# Altium schematic symbol library jlcpcb_2025_04_capacitors_extended_0402.schlib: 3594 symbols (part 3 of 20) (continued)
## 0402N500J500CT
designator C?  Capacitance: 50pF  (hidden comment: *)
Capacitor, Ceramic (MLCC), 50pF, ±5%, 50V, NP0, ±5%, SMD 0402; Manufacturer: Walsin Tech Corp; Manufacturer Part Number: 0402N500J500CT; Package Size: 0402; JLCPCB Basic Part: No; JLCPCB Part Number: C458867; Supplier 1: LCSC; Category: Capacitors - MLCC; Supplier Part Number 1: C458867; Tolerance: ±5%; Voltage Rating: 50V; Temperature Coefficient: NP0; RoHS: Yes; ComponentLink1Description: Datasheet; ComponentLink1URL: https://wmsc.lcsc.com/wmsc/upload/file/pdf/v2/lcsc/2304140030_Walsin-Tech-Corp-0402N500J500CT_C458867.pdf; ComponentLink2Description: JLCPCB Part URL; ComponentLink2URL: https://jlcpcb.com/partdetail/C458867; ComponentLink3Description: LCSC Part URL; ComponentLink3URL: https://lcsc.com/product-detail/Multilayer-Ceramic-Capacitors-MLCC---SMD-SMT_Walsin-Tech-Corp-Walsin-Tech-Corp-0402N500J500CT_C458867.html
footprint CAP-0402 (0402 (1005M) Capacitor)
pins: 1, 2

## 0402N510J500CT
designator C?  Capacitance: 51pF  (hidden comment: *)
Capacitor, Ceramic (MLCC), 51pF, ±5%, 50V, NP0, ±5%, SMD 0402; Manufacturer: Walsin Tech Corp; Manufacturer Part Number: 0402N510J500CT; Package Size: 0402; JLCPCB Basic Part: No; JLCPCB Part Number: C295991; Supplier 1: LCSC; Category: Capacitors - MLCC; Supplier Part Number 1: C295991; Tolerance: ±5%; Voltage Rating: 50V; Temperature Coefficient: NP0; RoHS: Yes; ComponentLink1Description: Datasheet; ComponentLink1URL: https://wmsc.lcsc.com/wmsc/upload/file/pdf/v2/lcsc/2304140030_Walsin-Tech-Corp-0402N510J500CT_C295991.pdf; ComponentLink2Description: JLCPCB Part URL; ComponentLink2URL: https://jlcpcb.com/partdetail/C295991; ComponentLink3Description: LCSC Part URL; ComponentLink3URL: https://lcsc.com/product-detail/Multilayer-Ceramic-Capacitors-MLCC---SMD-SMT_Walsin-Tech-Corp-Walsin-Tech-Corp-0402N510J500CT_C295991.html
footprint CAP-0402 (0402 (1005M) Capacitor)
pins: 1, 2

## 0402N511J500CT
designator C?  Capacitance: 510pF  (hidden comment: *)
Capacitor, Ceramic (MLCC), 510pF, ±5%, 50V, NP0, ±5%, SMD 0402; Manufacturer: Walsin Tech Corp; Manufacturer Part Number: 0402N511J500CT; Package Size: 0402; JLCPCB Basic Part: No; JLCPCB Part Number: C387980; Supplier 1: LCSC; Category: Capacitors - MLCC; Supplier Part Number 1: C387980; Tolerance: ±5%; Voltage Rating: 50V; Temperature Coefficient: NP0; RoHS: Yes; ComponentLink1Description: Datasheet; ComponentLink1URL: https://wmsc.lcsc.com/wmsc/upload/file/pdf/v2/lcsc/2304140030_Walsin-Tech-Corp-0402N511J500CT_C387980.pdf; ComponentLink2Description: JLCPCB Part URL; ComponentLink2URL: https://jlcpcb.com/partdetail/C387980; ComponentLink3Description: LCSC Part URL; ComponentLink3URL: https://lcsc.com/product-detail/Multilayer-Ceramic-Capacitors-MLCC---SMD-SMT_Walsin-Tech-Corp-Walsin-Tech-Corp-0402N511J500CT_C387980.html
footprint CAP-0402 (0402 (1005M) Capacitor)
pins: 1, 2

## 0402N560G500CT
designator C?  Capacitance: 56pF  (hidden comment: *)
Capacitor, Ceramic (MLCC), 56pF, ±2%, 50V, NP0, ±2%, SMD 0402; Manufacturer: Walsin Tech Corp; Manufacturer Part Number: 0402N560G500CT; Package Size: 0402; JLCPCB Basic Part: No; JLCPCB Part Number: C388118; Supplier 1: LCSC; Category: Capacitors - MLCC; Supplier Part Number 1: C388118; Tolerance: ±2%; Voltage Rating: 50V; Temperature Coefficient: NP0; RoHS: Yes; ComponentLink1Description: Datasheet; ComponentLink1URL: https://wmsc.lcsc.com/wmsc/upload/file/pdf/v2/lcsc/2304140030_Walsin-Tech-Corp-0402N560G500CT_C388118.pdf; ComponentLink2Description: JLCPCB Part URL; ComponentLink2URL: https://jlcpcb.com/partdetail/C388118; ComponentLink3Description: LCSC Part URL; ComponentLink3URL: https://lcsc.com/product-detail/Multilayer-Ceramic-Capacitors-MLCC---SMD-SMT_Walsin-Tech-Corp-Walsin-Tech-Corp-0402N560G500CT_C388118.html
footprint CAP-0402 (0402 (1005M) Capacitor)
pins: 1, 2

## 0402N560J101CT
designator C?  Capacitance: 56pF  (hidden comment: *)
Capacitor, Ceramic (MLCC), 56pF, ±5%, 100V, NP0, ±5%, SMD 0402; Manufacturer: Walsin Tech Corp; Manufacturer Part Number: 0402N560J101CT; Package Size: 0402; JLCPCB Basic Part: No; JLCPCB Part Number: C525497; Supplier 1: LCSC; Category: Capacitors - MLCC; Supplier Part Number 1: C525497; Tolerance: ±5%; Voltage Rating: 100V; Temperature Coefficient: NP0; RoHS: Yes; ComponentLink1Description: Datasheet; ComponentLink1URL: https://wmsc.lcsc.com/wmsc/upload/file/pdf/v2/lcsc/2304140030_Walsin-Tech-Corp-0402N560J101CT_C525497.pdf; ComponentLink2Description: JLCPCB Part URL; ComponentLink2URL: https://jlcpcb.com/partdetail/C525497; ComponentLink3Description: LCSC Part URL; ComponentLink3URL: https://lcsc.com/product-detail/Multilayer-Ceramic-Capacitors-MLCC---SMD-SMT_Walsin-Tech-Corp-Walsin-Tech-Corp-0402N560J101CT_C525497.html
footprint CAP-0402 (0402 (1005M) Capacitor)
pins: 1, 2

## 0402N560J500CT
designator C?  Capacitance: 56pF  (hidden comment: *)
Capacitor, Ceramic (MLCC), 56pF, ±5%, 50V, NP0, ±5%, SMD 0402; Manufacturer: Walsin Tech Corp; Manufacturer Part Number: 0402N560J500CT; Package Size: 0402; JLCPCB Basic Part: No; JLCPCB Part Number: C301986; Supplier 1: LCSC; Category: Capacitors - MLCC; Supplier Part Number 1: C301986; Tolerance: ±5%; Voltage Rating: 50V; Temperature Coefficient: NP0; RoHS: Yes; ComponentLink1Description: Datasheet; ComponentLink1URL: https://wmsc.lcsc.com/wmsc/upload/file/pdf/v2/lcsc/2304140030_Walsin-Tech-Corp-0402N560J500CT_C301986.pdf; ComponentLink2Description: JLCPCB Part URL; ComponentLink2URL: https://jlcpcb.com/partdetail/C301986; ComponentLink3Description: LCSC Part URL; ComponentLink3URL: https://lcsc.com/product-detail/Multilayer-Ceramic-Capacitors-MLCC---SMD-SMT_Walsin-Tech-Corp-Walsin-Tech-Corp-0402N560J500CT_C301986.html
footprint CAP-0402 (0402 (1005M) Capacitor)
pins: 1, 2

## 0402N561J500CT
designator C?  Capacitance: 560pF  (hidden comment: *)
Capacitor, Ceramic (MLCC), 560pF, ±5%, 50V, NP0, ±5%, SMD 0402; Manufacturer: Walsin Tech Corp; Manufacturer Part Number: 0402N561J500CT; Package Size: 0402; JLCPCB Basic Part: No; JLCPCB Part Number: C295992; Supplier 1: LCSC; Category: Capacitors - MLCC; Supplier Part Number 1: C295992; Tolerance: ±5%; Voltage Rating: 50V; Temperature Coefficient: NP0; RoHS: Yes; ComponentLink1Description: Datasheet; ComponentLink1URL: https://wmsc.lcsc.com/wmsc/upload/file/pdf/v2/lcsc/2304140030_Walsin-Tech-Corp-0402N561J500CT_C295992.pdf; ComponentLink2Description: JLCPCB Part URL; ComponentLink2URL: https://jlcpcb.com/partdetail/C295992; ComponentLink3Description: LCSC Part URL; ComponentLink3URL: https://lcsc.com/product-detail/Multilayer-Ceramic-Capacitors-MLCC---SMD-SMT_Walsin-Tech-Corp-Walsin-Tech-Corp-0402N561J500CT_C295992.html
footprint CAP-0402 (0402 (1005M) Capacitor)
pins: 1, 2

## 0402N620J500CT
designator C?  Capacitance: 62pF  (hidden comment: *)
Capacitor, Ceramic (MLCC), 62pF, ±5%, 50V, NP0, ±5%, SMD 0402; Manufacturer: Walsin Tech Corp; Manufacturer Part Number: 0402N620J500CT; Package Size: 0402; JLCPCB Basic Part: No; JLCPCB Part Number: C295994; Supplier 1: LCSC; Category: Capacitors - MLCC; Supplier Part Number 1: C295994; Tolerance: ±5%; Voltage Rating: 50V; Temperature Coefficient: NP0; RoHS: Yes; ComponentLink1Description: Datasheet; ComponentLink1URL: https://wmsc.lcsc.com/wmsc/upload/file/pdf/v2/lcsc/2304140030_Walsin-Tech-Corp-0402N620J500CT_C295994.pdf; ComponentLink2Description: JLCPCB Part URL; ComponentLink2URL: https://jlcpcb.com/partdetail/C295994; ComponentLink3Description: LCSC Part URL; ComponentLink3URL: https://lcsc.com/product-detail/Multilayer-Ceramic-Capacitors-MLCC---SMD-SMT_Walsin-Tech-Corp-Walsin-Tech-Corp-0402N620J500CT_C295994.html
footprint CAP-0402 (0402 (1005M) Capacitor)
pins: 1, 2

## 0402N621J500CT
designator C?  Capacitance: 620pF  (hidden comment: *)
Capacitor, Ceramic (MLCC), 620pF, ±5%, 50V, NP0, ±5%, SMD 0402; Manufacturer: Walsin Tech Corp; Manufacturer Part Number: 0402N621J500CT; Package Size: 0402; JLCPCB Basic Part: No; JLCPCB Part Number: C387982; Supplier 1: LCSC; Category: Capacitors - MLCC; Supplier Part Number 1: C387982; Tolerance: ±5%; Voltage Rating: 50V; Temperature Coefficient: NP0; RoHS: Yes; ComponentLink1Description: Datasheet; ComponentLink1URL: https://wmsc.lcsc.com/wmsc/upload/file/pdf/v2/lcsc/2304140030_Walsin-Tech-Corp-0402N621J500CT_C387982.pdf; ComponentLink2Description: JLCPCB Part URL; ComponentLink2URL: https://jlcpcb.com/partdetail/C387982; ComponentLink3Description: LCSC Part URL; ComponentLink3URL: https://lcsc.com/product-detail/Multilayer-Ceramic-Capacitors-MLCC---SMD-SMT_Walsin-Tech-Corp-Walsin-Tech-Corp-0402N621J500CT_C387982.html
footprint CAP-0402 (0402 (1005M) Capacitor)
pins: 1, 2

## 0402N680F500CT
designator C?  Capacitance: 68pF  (hidden comment: *)
Capacitor, Ceramic (MLCC), 68pF, ±1%, 50V, NP0, ±1%, SMD 0402; Manufacturer: Walsin Tech Corp; Manufacturer Part Number: 0402N680F500CT; Package Size: 0402; JLCPCB Basic Part: No; JLCPCB Part Number: C458869; Supplier 1: LCSC; Category: Capacitors - MLCC; Supplier Part Number 1: C458869; Tolerance: ±1%; Voltage Rating: 50V; Temperature Coefficient: NP0; RoHS: Yes; ComponentLink1Description: Datasheet; ComponentLink1URL: https://wmsc.lcsc.com/wmsc/upload/file/pdf/v2/lcsc/2304140030_Walsin-Tech-Corp-0402N680F500CT_C458869.pdf; ComponentLink2Description: JLCPCB Part URL; ComponentLink2URL: https://jlcpcb.com/partdetail/C458869; ComponentLink3Description: LCSC Part URL; ComponentLink3URL: https://lcsc.com/product-detail/Multilayer-Ceramic-Capacitors-MLCC---SMD-SMT_Walsin-Tech-Corp-Walsin-Tech-Corp-0402N680F500CT_C458869.html
footprint CAP-0402 (0402 (1005M) Capacitor)
pins: 1, 2

## 0402N680J500CT
designator C?  Capacitance: 68pF  (hidden comment: *)
Capacitor, Ceramic (MLCC), 68pF, ±5%, 50V, NP0, ±5%, SMD 0402; Manufacturer: Walsin Tech Corp; Manufacturer Part Number: 0402N680J500CT; Package Size: 0402; JLCPCB Basic Part: No; JLCPCB Part Number: C301990; Supplier 1: LCSC; Category: Capacitors - MLCC; Supplier Part Number 1: C301990; Tolerance: ±5%; Voltage Rating: 50V; Temperature Coefficient: NP0; RoHS: Yes; ComponentLink1Description: Datasheet; ComponentLink1URL: https://wmsc.lcsc.com/wmsc/upload/file/pdf/v2/lcsc/2304140030_Walsin-Tech-Corp-0402N680J500CT_C301990.pdf; ComponentLink2Description: JLCPCB Part URL; ComponentLink2URL: https://jlcpcb.com/partdetail/C301990; ComponentLink3Description: LCSC Part URL; ComponentLink3URL: https://lcsc.com/product-detail/Multilayer-Ceramic-Capacitors-MLCC---SMD-SMT_Walsin-Tech-Corp-Walsin-Tech-Corp-0402N680J500CT_C301990.html
footprint CAP-0402 (0402 (1005M) Capacitor)
pins: 1, 2

## 0402N680K500CT
designator C?  Capacitance: 68pF  (hidden comment: *)
Capacitor, Ceramic (MLCC), 68pF, ±10%, 50V, NP0, ±10%, SMD 0402; Manufacturer: Walsin Tech Corp; Manufacturer Part Number: 0402N680K500CT; Package Size: 0402; JLCPCB Basic Part: No; JLCPCB Part Number: C295995; Supplier 1: LCSC; Category: Capacitors - MLCC; Supplier Part Number 1: C295995; Tolerance: ±10%; Voltage Rating: 50V; Temperature Coefficient: NP0; RoHS: Yes; ComponentLink1Description: Datasheet; ComponentLink1URL: https://wmsc.lcsc.com/wmsc/upload/file/pdf/v2/lcsc/2304140030_Walsin-Tech-Corp-0402N680K500CT_C295995.pdf; ComponentLink2Description: JLCPCB Part URL; ComponentLink2URL: https://jlcpcb.com/partdetail/C295995; ComponentLink3Description: LCSC Part URL; ComponentLink3URL: https://lcsc.com/product-detail/Multilayer-Ceramic-Capacitors-MLCC---SMD-SMT_Walsin-Tech-Corp-Walsin-Tech-Corp-0402N680K500CT_C295995.html
footprint CAP-0402 (0402 (1005M) Capacitor)
pins: 1, 2

## 0402N681J500CT
designator C?  Capacitance: 680pF  (hidden comment: *)
Capacitor, Ceramic (MLCC), 680pF, ±5%, 50V, NP0, ±5%, SMD 0402; Manufacturer: Walsin Tech Corp; Manufacturer Part Number: 0402N681J500CT; Package Size: 0402; JLCPCB Basic Part: No; JLCPCB Part Number: C295996; Supplier 1: LCSC; Category: Capacitors - MLCC; Supplier Part Number 1: C295996; Tolerance: ±5%; Voltage Rating: 50V; Temperature Coefficient: NP0; RoHS: Yes; ComponentLink1Description: Datasheet; ComponentLink1URL: https://wmsc.lcsc.com/wmsc/upload/file/pdf/v2/lcsc/2304140030_Walsin-Tech-Corp-0402N681J500CT_C295996.pdf; ComponentLink2Description: JLCPCB Part URL; ComponentLink2URL: https://jlcpcb.com/partdetail/C295996; ComponentLink3Description: LCSC Part URL; ComponentLink3URL: https://lcsc.com/product-detail/Multilayer-Ceramic-Capacitors-MLCC---SMD-SMT_Walsin-Tech-Corp-Walsin-Tech-Corp-0402N681J500CT_C295996.html
footprint CAP-0402 (0402 (1005M) Capacitor)
pins: 1, 2

## 0402N820F500CT
designator C?  Capacitance: 82pF  (hidden comment: *)
Capacitor, Ceramic (MLCC), 82pF, ±1%, 50V, NP0, ±1%, SMD 0402; Manufacturer: Walsin Tech Corp; Manufacturer Part Number: 0402N820F500CT; Package Size: 0402; JLCPCB Basic Part: No; JLCPCB Part Number: C458871; Supplier 1: LCSC; Category: Capacitors - MLCC; Supplier Part Number 1: C458871; Tolerance: ±1%; Voltage Rating: 50V; Temperature Coefficient: NP0; RoHS: Yes; ComponentLink1Description: Datasheet; ComponentLink1URL: https://wmsc.lcsc.com/wmsc/upload/file/pdf/v2/lcsc/2304140030_Walsin-Tech-Corp-0402N820F500CT_C458871.pdf; ComponentLink2Description: JLCPCB Part URL; ComponentLink2URL: https://jlcpcb.com/partdetail/C458871; ComponentLink3Description: LCSC Part URL; ComponentLink3URL: https://lcsc.com/product-detail/Multilayer-Ceramic-Capacitors-MLCC---SMD-SMT_Walsin-Tech-Corp-Walsin-Tech-Corp-0402N820F500CT_C458871.html
footprint CAP-0402 (0402 (1005M) Capacitor)
pins: 1, 2

## 0402N820J250CT
designator C?  Capacitance: 82pF  (hidden comment: *)
Capacitor, Ceramic (MLCC), 82pF, ±5%, 25V, NP0, ±5%, SMD 0402; Manufacturer: Walsin Tech Corp; Manufacturer Part Number: 0402N820J250CT; Package Size: 0402; JLCPCB Basic Part: No; JLCPCB Part Number: C335531; Supplier 1: LCSC; Category: Capacitors - MLCC; Supplier Part Number 1: C335531; Tolerance: ±5%; Voltage Rating: 25V; Temperature Coefficient: NP0; RoHS: Yes; ComponentLink1Description: Datasheet; ComponentLink1URL: https://wmsc.lcsc.com/wmsc/upload/file/pdf/v2/lcsc/2304140030_Walsin-Tech-Corp-0402N820J250CT_C335531.pdf; ComponentLink2Description: JLCPCB Part URL; ComponentLink2URL: https://jlcpcb.com/partdetail/C335531; ComponentLink3Description: LCSC Part URL; ComponentLink3URL: https://lcsc.com/product-detail/Multilayer-Ceramic-Capacitors-MLCC---SMD-SMT_Walsin-Tech-Corp-Walsin-Tech-Corp-0402N820J250CT_C335531.html
footprint CAP-0402 (0402 (1005M) Capacitor)
pins: 1, 2

## 0402N820J500CT
designator C?  Capacitance: 82pF  (hidden comment: *)
Capacitor, Ceramic (MLCC), 82pF, ±5%, 50V, NP0, ±5%, SMD 0402; Manufacturer: Walsin Tech Corp; Manufacturer Part Number: 0402N820J500CT; Package Size: 0402; JLCPCB Basic Part: No; JLCPCB Part Number: C301993; Supplier 1: LCSC; Category: Capacitors - MLCC; Supplier Part Number 1: C301993; Tolerance: ±5%; Voltage Rating: 50V; Temperature Coefficient: NP0; RoHS: Yes; ComponentLink1Description: Datasheet; ComponentLink1URL: https://wmsc.lcsc.com/wmsc/upload/file/pdf/v2/lcsc/2304140030_Walsin-Tech-Corp-0402N820J500CT_C301993.pdf; ComponentLink2Description: JLCPCB Part URL; ComponentLink2URL: https://jlcpcb.com/partdetail/C301993; ComponentLink3Description: LCSC Part URL; ComponentLink3URL: https://lcsc.com/product-detail/Multilayer-Ceramic-Capacitors-MLCC---SMD-SMT_Walsin-Tech-Corp-Walsin-Tech-Corp-0402N820J500CT_C301993.html
footprint CAP-0402 (0402 (1005M) Capacitor)
pins: 1, 2

## 0402N820K500CT
designator C?  Capacitance: 82pF  (hidden comment: *)
Capacitor, Ceramic (MLCC), 82pF, ±10%, 50V, NP0, ±10%, SMD 0402; Manufacturer: Walsin Tech Corp; Manufacturer Part Number: 0402N820K500CT; Package Size: 0402; JLCPCB Basic Part: No; JLCPCB Part Number: C296003; Supplier 1: LCSC; Category: Capacitors - MLCC; Supplier Part Number 1: C296003; Tolerance: ±10%; Voltage Rating: 50V; Temperature Coefficient: NP0; RoHS: Yes; ComponentLink1Description: Datasheet; ComponentLink1URL: https://wmsc.lcsc.com/wmsc/upload/file/pdf/v2/lcsc/2304140030_Walsin-Tech-Corp-0402N820K500CT_C296003.pdf; ComponentLink2Description: JLCPCB Part URL; ComponentLink2URL: https://jlcpcb.com/partdetail/C296003; ComponentLink3Description: LCSC Part URL; ComponentLink3URL: https://lcsc.com/product-detail/Multilayer-Ceramic-Capacitors-MLCC---SMD-SMT_Walsin-Tech-Corp-Walsin-Tech-Corp-0402N820K500CT_C296003.html
footprint CAP-0402 (0402 (1005M) Capacitor)
pins: 1, 2

## 0402N821J500CT
designator C?  Capacitance: 820pF  (hidden comment: *)
Capacitor, Ceramic (MLCC), 820pF, ±5%, 50V, NP0, ±5%, SMD 0402; Manufacturer: Walsin Tech Corp; Manufacturer Part Number: 0402N821J500CT; Package Size: 0402; JLCPCB Basic Part: No; JLCPCB Part Number: C296004; Supplier 1: LCSC; Category: Capacitors - MLCC; Supplier Part Number 1: C296004; Tolerance: ±5%; Voltage Rating: 50V; Temperature Coefficient: NP0; RoHS: Yes; ComponentLink1Description: Datasheet; ComponentLink1URL: https://wmsc.lcsc.com/wmsc/upload/file/pdf/v2/lcsc/2304140030_Walsin-Tech-Corp-0402N821J500CT_C296004.pdf; ComponentLink2Description: JLCPCB Part URL; ComponentLink2URL: https://jlcpcb.com/partdetail/C296004; ComponentLink3Description: LCSC Part URL; ComponentLink3URL: https://lcsc.com/product-detail/Multilayer-Ceramic-Capacitors-MLCC---SMD-SMT_Walsin-Tech-Corp-Walsin-Tech-Corp-0402N821J500CT_C296004.html
footprint CAP-0402 (0402 (1005M) Capacitor)
pins: 1, 2

## 0402N910J500CT
designator C?  Capacitance: 91pF  (hidden comment: *)
Capacitor, Ceramic (MLCC), 91pF, ±5%, 50V, NP0, ±5%, SMD 0402; Manufacturer: Walsin Tech Corp; Manufacturer Part Number: 0402N910J500CT; Package Size: 0402; JLCPCB Basic Part: No; JLCPCB Part Number: C296008; Supplier 1: LCSC; Category: Capacitors - MLCC; Supplier Part Number 1: C296008; Tolerance: ±5%; Voltage Rating: 50V; Temperature Coefficient: NP0; RoHS: Yes; ComponentLink1Description: Datasheet; ComponentLink1URL: https://wmsc.lcsc.com/wmsc/upload/file/pdf/v2/lcsc/2304140030_Walsin-Tech-Corp-0402N910J500CT_C296008.pdf; ComponentLink2Description: JLCPCB Part URL; ComponentLink2URL: https://jlcpcb.com/partdetail/C296008; ComponentLink3Description: LCSC Part URL; ComponentLink3URL: https://lcsc.com/product-detail/Multilayer-Ceramic-Capacitors-MLCC---SMD-SMT_Walsin-Tech-Corp-Walsin-Tech-Corp-0402N910J500CT_C296008.html
footprint CAP-0402 (0402 (1005M) Capacitor)
pins: 1, 2

## 0402NR75B500CT
designator C?  Capacitance: 0.75pF  (hidden comment: *)
Capacitor, Ceramic (MLCC), 0.75pF, 50V, NP0, SMD 0402; Manufacturer: Walsin Tech Corp; Manufacturer Part Number: 0402NR75B500CT; Package Size: 0402; JLCPCB Basic Part: No; JLCPCB Part Number: C469637; Supplier 1: LCSC; Category: Capacitors - MLCC; Supplier Part Number 1: C469637; Voltage Rating: 50V; Temperature Coefficient: NP0; RoHS: Yes; ComponentLink1Description: Datasheet; ComponentLink1URL: https://wmsc.lcsc.com/wmsc/upload/file/pdf/v2/lcsc/2304140030_Walsin-Tech-Corp-0402NR75B500CT_C469637.pdf; ComponentLink2Description: JLCPCB Part URL; ComponentLink2URL: https://jlcpcb.com/partdetail/C469637; ComponentLink3Description: LCSC Part URL; ComponentLink3URL: https://lcsc.com/product-detail/Multilayer-Ceramic-Capacitors-MLCC---SMD-SMT_Walsin-Tech-Corp-Walsin-Tech-Corp-0402NR75B500CT_C469637.html
footprint CAP-0402 (0402 (1005M) Capacitor)
pins: 1, 2

## 0402NR75C500CT
designator C?  Capacitance: 0.75pF  (hidden comment: *)
Capacitor, Ceramic (MLCC), 0.75pF, 50V, NP0, SMD 0402; Manufacturer: Walsin Tech Corp; Manufacturer Part Number: 0402NR75C500CT; Package Size: 0402; JLCPCB Basic Part: No; JLCPCB Part Number: C301996; Supplier 1: LCSC; Category: Capacitors - MLCC; Supplier Part Number 1: C301996; Voltage Rating: 50V; Temperature Coefficient: NP0; RoHS: Yes; ComponentLink1Description: Datasheet; ComponentLink1URL: https://wmsc.lcsc.com/wmsc/upload/file/pdf/v2/lcsc/2304140030_Walsin-Tech-Corp-0402NR75C500CT_C301996.pdf; ComponentLink2Description: JLCPCB Part URL; ComponentLink2URL: https://jlcpcb.com/partdetail/C301996; ComponentLink3Description: LCSC Part URL; ComponentLink3URL: https://lcsc.com/product-detail/Multilayer-Ceramic-Capacitors-MLCC---SMD-SMT_Walsin-Tech-Corp-Walsin-Tech-Corp-0402NR75C500CT_C301996.html
footprint CAP-0402 (0402 (1005M) Capacitor)
pins: 1, 2

## 0402X104K6R3
designator C?  Capacitance: 100nF  (hidden comment: *)
Capacitor, Ceramic (MLCC), 100nF, ±10%, 6.3V, X5R, ±10%, SMD 0402; Manufacturer: Walsin Tech Corp; Manufacturer Part Number: 0402X104K6R3; Package Size: 0402; JLCPCB Basic Part: No; JLCPCB Part Number: C152780; Supplier 1: LCSC; Category: Capacitors - MLCC; Supplier Part Number 1: C152780; Tolerance: ±10%; Voltage Rating: 6.3V; Temperature Coefficient: X5R; RoHS: Yes; ComponentLink1Description: Datasheet; ComponentLink1URL: https://wmsc.lcsc.com/wmsc/upload/file/pdf/v2/lcsc/2304140030_Walsin-Tech-Corp-0402X104K6R3_C152780.pdf; ComponentLink2Description: JLCPCB Part URL; ComponentLink2URL: https://jlcpcb.com/partdetail/C152780; ComponentLink3Description: LCSC Part URL; ComponentLink3URL: https://lcsc.com/product-detail/Multilayer-Ceramic-Capacitors-MLCC---SMD-SMT_Walsin-Tech-Corp-Walsin-Tech-Corp-0402X104K6R3_C152780.html
footprint CAP-0402 (0402 (1005M) Capacitor)
pins: 1, 2

## 0402X104K100CT
designator C?  Capacitance: 100nF  (hidden comment: *)
Capacitor, Ceramic (MLCC), 100nF, ±10%, 10V, X5R, ±10%, SMD 0402; Manufacturer: Walsin Tech Corp; Manufacturer Part Number: 0402X104K100CT; Package Size: 0402; JLCPCB Basic Part: No; JLCPCB Part Number: C387958; Supplier 1: LCSC; Category: Capacitors - MLCC; Supplier Part Number 1: C387958; Tolerance: ±10%; Voltage Rating: 10V; Temperature Coefficient: X5R; RoHS: Yes; ComponentLink1Description: Datasheet; ComponentLink1URL: https://wmsc.lcsc.com/wmsc/upload/file/pdf/v2/lcsc/2304140030_Walsin-Tech-Corp-0402X104K100CT_C387958.pdf; ComponentLink2Description: JLCPCB Part URL; ComponentLink2URL: https://jlcpcb.com/partdetail/C387958; ComponentLink3Description: LCSC Part URL; ComponentLink3URL: https://lcsc.com/product-detail/Multilayer-Ceramic-Capacitors-MLCC---SMD-SMT_Walsin-Tech-Corp-Walsin-Tech-Corp-0402X104K100CT_C387958.html
footprint CAP-0402 (0402 (1005M) Capacitor)
pins: 1, 2

## 0402X104K160CT
designator C?  Capacitance: 100nF  (hidden comment: *)
Capacitor, Ceramic (MLCC), 100nF, ±10%, 16V, X5R, ±10%, SMD 0402; Manufacturer: Walsin Tech Corp; Manufacturer Part Number: 0402X104K160CT; Package Size: 0402; JLCPCB Basic Part: No; JLCPCB Part Number: C301997; Supplier 1: LCSC; Category: Capacitors - MLCC; Supplier Part Number 1: C301997; Tolerance: ±10%; Voltage Rating: 16V; Temperature Coefficient: X5R; RoHS: Yes; ComponentLink1Description: Datasheet; ComponentLink1URL: https://wmsc.lcsc.com/wmsc/upload/file/pdf/v2/lcsc/2304140030_Walsin-Tech-Corp-0402X104K160CT_C301997.pdf; ComponentLink2Description: JLCPCB Part URL; ComponentLink2URL: https://jlcpcb.com/partdetail/C301997; ComponentLink3Description: LCSC Part URL; ComponentLink3URL: https://lcsc.com/product-detail/Multilayer-Ceramic-Capacitors-MLCC---SMD-SMT_Walsin-Tech-Corp-Walsin-Tech-Corp-0402X104K160CT_C301997.html
footprint CAP-0402 (0402 (1005M) Capacitor)
pins: 1, 2

## 0402X104K250CT
designator C?  Capacitance: 100nF  (hidden comment: *)
Capacitor, Ceramic (MLCC), 100nF, ±10%, 25V, X5R, ±10%, SMD 0402; Manufacturer: Walsin Tech Corp; Manufacturer Part Number: 0402X104K250CT; Package Size: 0402; JLCPCB Basic Part: No; JLCPCB Part Number: C237172; Supplier 1: LCSC; Category: Capacitors - MLCC; Supplier Part Number 1: C237172; Tolerance: ±10%; Voltage Rating: 25V; Temperature Coefficient: X5R; RoHS: Yes; ComponentLink1Description: Datasheet; ComponentLink1URL: https://wmsc.lcsc.com/wmsc/upload/file/pdf/v2/lcsc/2304140030_Walsin-Tech-Corp-0402X104K250CT_C237172.pdf; ComponentLink2Description: JLCPCB Part URL; ComponentLink2URL: https://jlcpcb.com/partdetail/C237172; ComponentLink3Description: LCSC Part URL; ComponentLink3URL: https://lcsc.com/product-detail/Multilayer-Ceramic-Capacitors-MLCC---SMD-SMT_Walsin-Tech-Corp-Walsin-Tech-Corp-0402X104K250CT_C237172.html
footprint CAP-0402 (0402 (1005M) Capacitor)
pins: 1, 2

## 0402X104K250NT
designator C?  Capacitance: 100nF  (hidden comment: *)
Capacitor, Ceramic (MLCC), 100nF, ±10%, 25V, X5R, ±10%, SMD 0402; Manufacturer: FH(Guangdong Fenghua Advanced Tech); Manufacturer Part Number: 0402X104K250NT; Package Size: 0402; JLCPCB Basic Part: No; JLCPCB Part Number: C165878; Supplier 1: LCSC; Category: Capacitors - MLCC; Supplier Part Number 1: C165878; Tolerance: ±10%; Voltage Rating: 25V; Temperature Coefficient: X5R; RoHS: Yes; ComponentLink1Description: Datasheet; ComponentLink1URL: https://wmsc.lcsc.com/wmsc/upload/file/pdf/v2/lcsc/2304140030_FH--Guangdong-Fenghua-Advanced-Tech-0402X104K250NT_C165878.pdf; ComponentLink2Description: JLCPCB Part URL; ComponentLink2URL: https://jlcpcb.com/partdetail/C165878; ComponentLink3Description: LCSC Part URL; ComponentLink3URL: https://lcsc.com/product-detail/Multilayer-Ceramic-Capacitors-MLCC---SMD-SMT_FH-Guangdong-Fenghua-Advanced-Tech-FH-Guangdong-Fenghua-Advanced-Tech-0402X104K250NT_C165878.html
footprint CAP-0402 (0402 (1005M) Capacitor)
pins: 1, 2

## 0402X104K500CT
designator C?  Capacitance: 100nF  (hidden comment: *)
Capacitor, Ceramic (MLCC), 100nF, ±10%, 50V, X5R, ±10%, SMD 0402; Manufacturer: Walsin Tech Corp; Manufacturer Part Number: 0402X104K500CT; Package Size: 0402; JLCPCB Basic Part: No; JLCPCB Part Number: C387959; Supplier 1: LCSC; Category: Capacitors - MLCC; Supplier Part Number 1: C387959; Tolerance: ±10%; Voltage Rating: 50V; Temperature Coefficient: X5R; RoHS: Yes; ComponentLink1Description: Datasheet; ComponentLink1URL: https://wmsc.lcsc.com/wmsc/upload/file/pdf/v2/lcsc/2304140030_Walsin-Tech-Corp-0402X104K500CT_C387959.pdf; ComponentLink2Description: JLCPCB Part URL; ComponentLink2URL: https://jlcpcb.com/partdetail/C387959; ComponentLink3Description: LCSC Part URL; ComponentLink3URL: https://lcsc.com/product-detail/Multilayer-Ceramic-Capacitors-MLCC---SMD-SMT_Walsin-Tech-Corp-Walsin-Tech-Corp-0402X104K500CT_C387959.html
footprint CAP-0402 (0402 (1005M) Capacitor)
pins: 1, 2